# Altium footprint library 未分类器件.PcbLib: 52 footprints (part 3 of 4)
Each footprint in its own frame and in the unit in brackets; x right, y up, seen from the top. Pads: shape width x height; smd on the part's side, far side on the other; paste and mask are expansions set on the pad; w line width, h text height; cw(c..) or ccw(c..) is an arc to the next point about the centre after c.
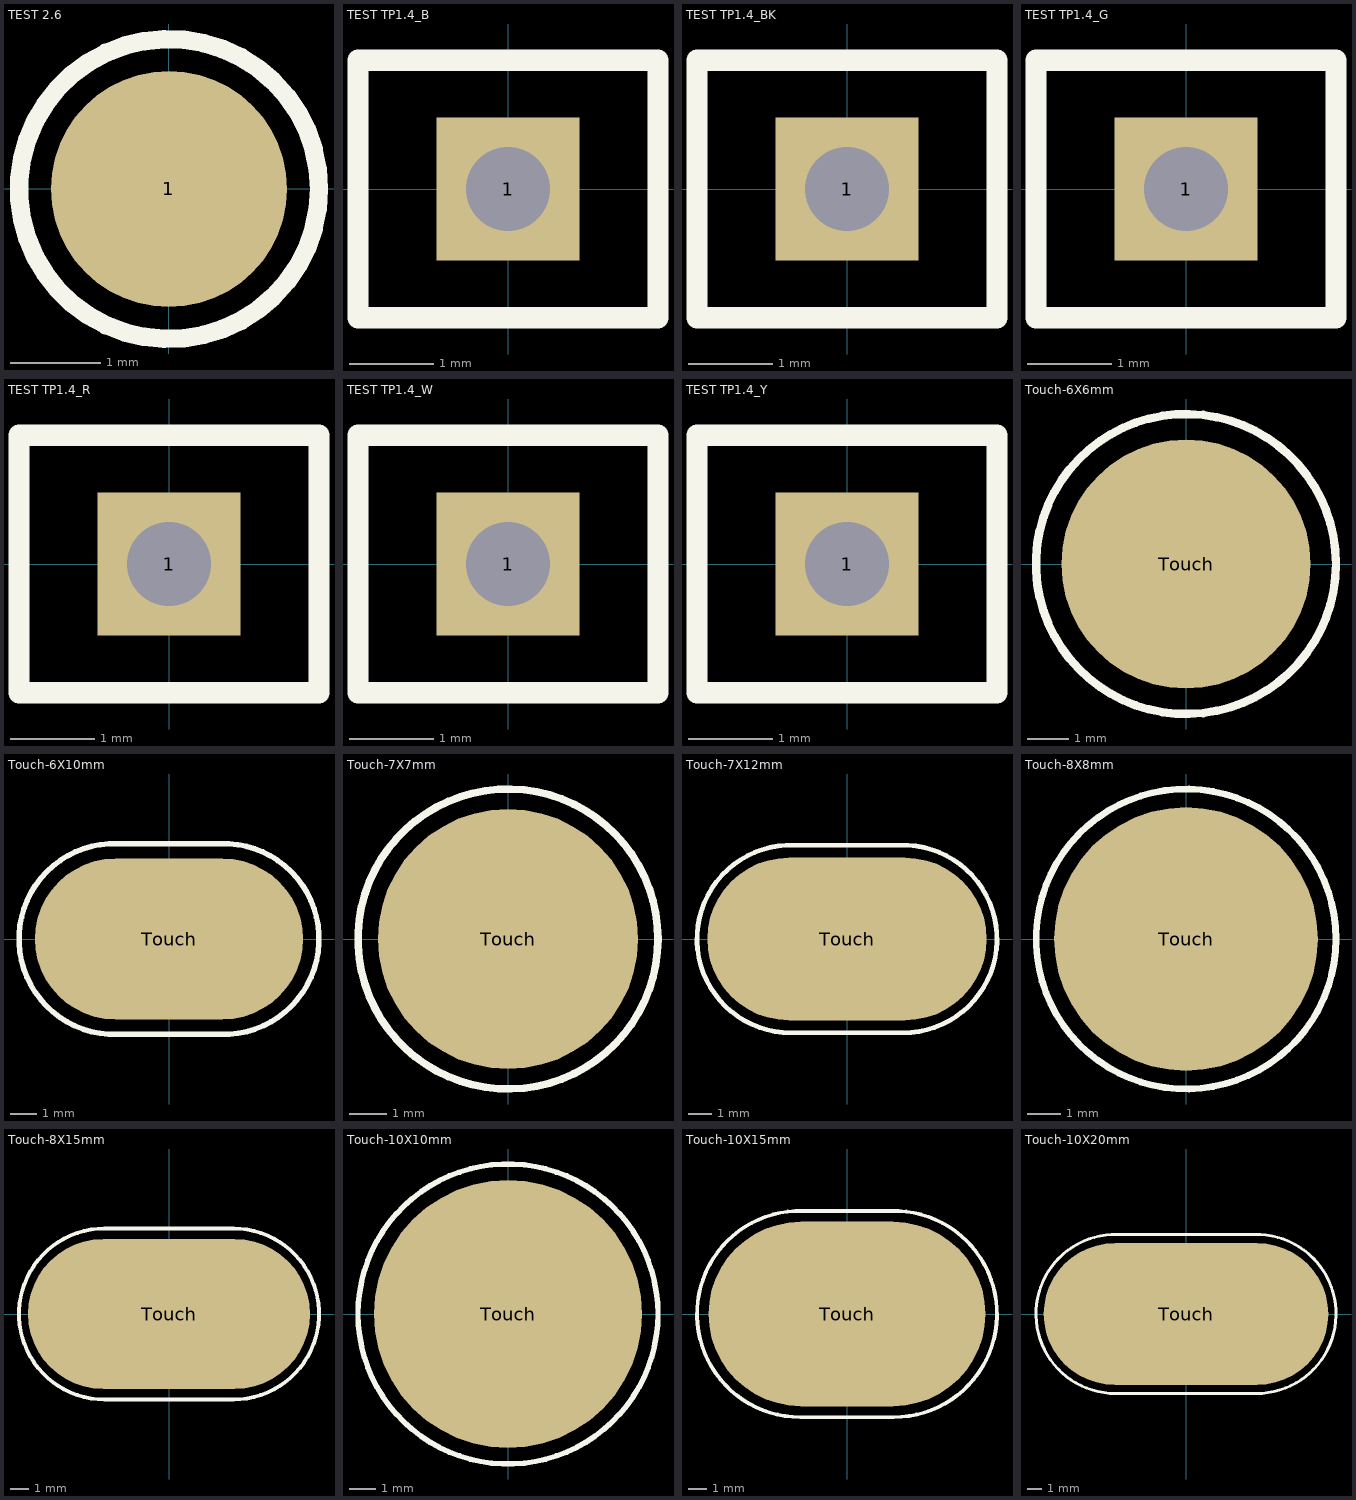
[diagram p2: the footprints below, top view; thin cyan lines are the x and y axes]

## TEST 2.6 [mm] "测试点2.6mm"
pads (1):
  round 2.6 smd paste-2.6: 1(0,0)
Top Overlay:
  circle w0.203: c0,0 r1.651

## TEST TP1.4_B [mm] "蓝色，测试环"
pads (1):
  rect 1.7x1.7 hole 1: 1(0,0)
Top Overlay:
  lines w0.254: -1.778,-1.524 -1.778,1.524 1.778,1.524 1.778,-1.524 -1.778,-1.524
3D body "TEST 3.5R_B.STEP": height 5.41, standoff -3.15, extent -1.675,-1.4 1.675,1.4

## TEST TP1.4_BK [mm] "黑色，测试环"
pads (1):
  rect 1.7x1.7 hole 1: 1(0,0)
Top Overlay:
  lines w0.254: -1.778,-1.524 -1.778,1.524 1.778,1.524 1.778,-1.524 -1.778,-1.524
3D body "TEST 3.5R_BK.STEP": height 5.41, standoff -3.15, extent -1.675,-1.4 1.675,1.4

## TEST TP1.4_G [mm] "绿色，测试环"
pads (1):
  rect 1.7x1.7 hole 1: 1(0,0)
Top Overlay:
  lines w0.254: -1.778,-1.524 -1.778,1.524 1.778,1.524 1.778,-1.524 -1.778,-1.524
3D body "TEST 3.5R_G.STEP": height 5.41, standoff -3.15, extent -1.675,-1.4 1.675,1.4

## TEST TP1.4_R [mm] "红色，测试环"
pads (1):
  rect 1.7x1.7 hole 1: 1(0,0)
Top Overlay:
  lines w0.254: -1.778,-1.524 1.778,-1.524 1.778,1.524 -1.778,1.524 -1.778,-1.524
3D body "TEST 3.5R_R.STEP": height 5.41, standoff -3.15, extent -1.675,-1.4 1.675,1.4

## TEST TP1.4_W [mm] "白色，测试环"
pads (1):
  rect 1.7x1.7 hole 1: 1(0,0)
Top Overlay:
  lines w0.254: -1.778,-1.524 1.778,-1.524 1.778,1.524 -1.778,1.524 -1.778,-1.524
3D body "TEST 3.5R_W.STEP": height 5.41, standoff -3.15, extent -1.675,-1.4 1.675,1.4

## TEST TP1.4_Y [mm] "黄色，测试环"
pads (1):
  rect 1.7x1.7 hole 1: 1(0,0)
Top Overlay:
  lines w0.254: -1.778,-1.524 1.778,-1.524 1.778,1.524 -1.778,1.524 -1.778,-1.524
3D body "TEST 3.5R_Y.STEP": height 5.41, standoff -3.15, extent -1.675,-1.4 1.675,1.4

## Touch-6X6mm [mm] "触摸焊盘6mm*6mm"
pads (1):
  round 6 smd paste-6 mask+0.5: Touch(0,0)
Top Overlay:
  circle w0.203: c0,0 r3.61
Keep-Out Layer:
  circle w0.1: c0,0 r1.5

## Touch-6X10mm [mm] "触摸焊盘6mm*10mm"
pads (1):
  oval 10x6 smd paste-6 mask+0.5: Touch(0,0)
Top Overlay:
  lines w0.203: -1.921,-3.557 cw(c-2.032,0) -1.905,3.556 1.905,3.556 cw(c2.032,0) 1.921,-3.557 -1.921,-3.557
Keep-Out Layer:
  circle w0.1: c0,0 r1.5

## Touch-7X7mm [mm] "触摸焊盘7mm*7mm"
pads (1):
  round 7 smd paste-7 mask+0.5: Touch(0,0)
Top Overlay:
  circle w0.203: c0,0 r4.034
Keep-Out Layer:
  circle w0.1: c0,0 r1.5

## Touch-7X12mm [mm] "触摸焊盘7mm*12mm"
pads (1):
  oval 12x7 smd paste-7 mask+0.5: Touch(0,0)
Top Overlay:
  lines w0.203: -2.413,-4.034 cw(c-2.413,0) -2.287,4.032 2.287,4.032 cw(c2.413,0) 2.413,-4.034 -2.413,-4.034
Keep-Out Layer:
  circle w0.1: c0,0 r1.5

## Touch-8X8mm [mm] "触摸焊盘8mm*8mm"
pads (1):
  round 8 smd paste-8 mask+0.5: Touch(0,0)
Top Overlay:
  circle w0.203: c0,0 r4.553
Keep-Out Layer:
  circle w0.1: c0,0 r1.5

## Touch-8X15mm [mm] "触摸焊盘8mm*15mm"
pads (1):
  oval 15x8 smd paste-8 mask+0.5: Touch(0,0)
Top Overlay:
  lines w0.203: -3.429,-4.553 cw(c-3.429,0) -3.429,4.553 3.429,4.553 cw(c3.429,0) 3.429,-4.553 -3.429,-4.553
Keep-Out Layer:
  circle w0.1: c0,0 r1.5

## Touch-10X10mm [mm] "触摸焊盘10mm*10mm"
pads (1):
  round 10 smd paste-10 mask+0.5: Touch(0,0)
Top Overlay:
  circle w0.203: c0,0 r5.589
Keep-Out Layer:
  circle w0.1: c0,0 r1.5

## Touch-10X15mm [mm] "触摸焊盘10mm*15mm"
pads (1):
  oval 15x10 smd paste-10 mask+0.5: Touch(0,0)
Top Overlay:
  lines w0.203: -2.54,-5.589 cw(c-2.54,0) -2.393,5.588 2.393,5.588 cw(c2.54,0) 2.54,-5.589 -2.54,-5.589
Keep-Out Layer:
  circle w0.1: c0,0 r1.5

## Touch-10X20mm [mm] "触摸焊盘10mm*20mm"
pads (1):
  oval 20x10 smd paste-10 mask+0.5: Touch(0,0)
Top Overlay:
  lines w0.203: -4.953,-5.589 cw(c-4.953,0) -4.806,5.588 4.806,5.588 cw(c4.953,0) 4.953,-5.589 -4.953,-5.589
Keep-Out Layer:
  circle w0.1: c0,0 r1.5